# Altium footprint library devices.PCBLIB: 335 footprints (part 11 of 21)
Each footprint in its own frame and in the unit in brackets; x right, y up, seen from the top. Pads: shape width x height; smd on the part's side, far side on the other; paste and mask are expansions set on the pad; w line width, h text height; cw(c..) or ccw(c..) is an arc to the next point about the centre after c.
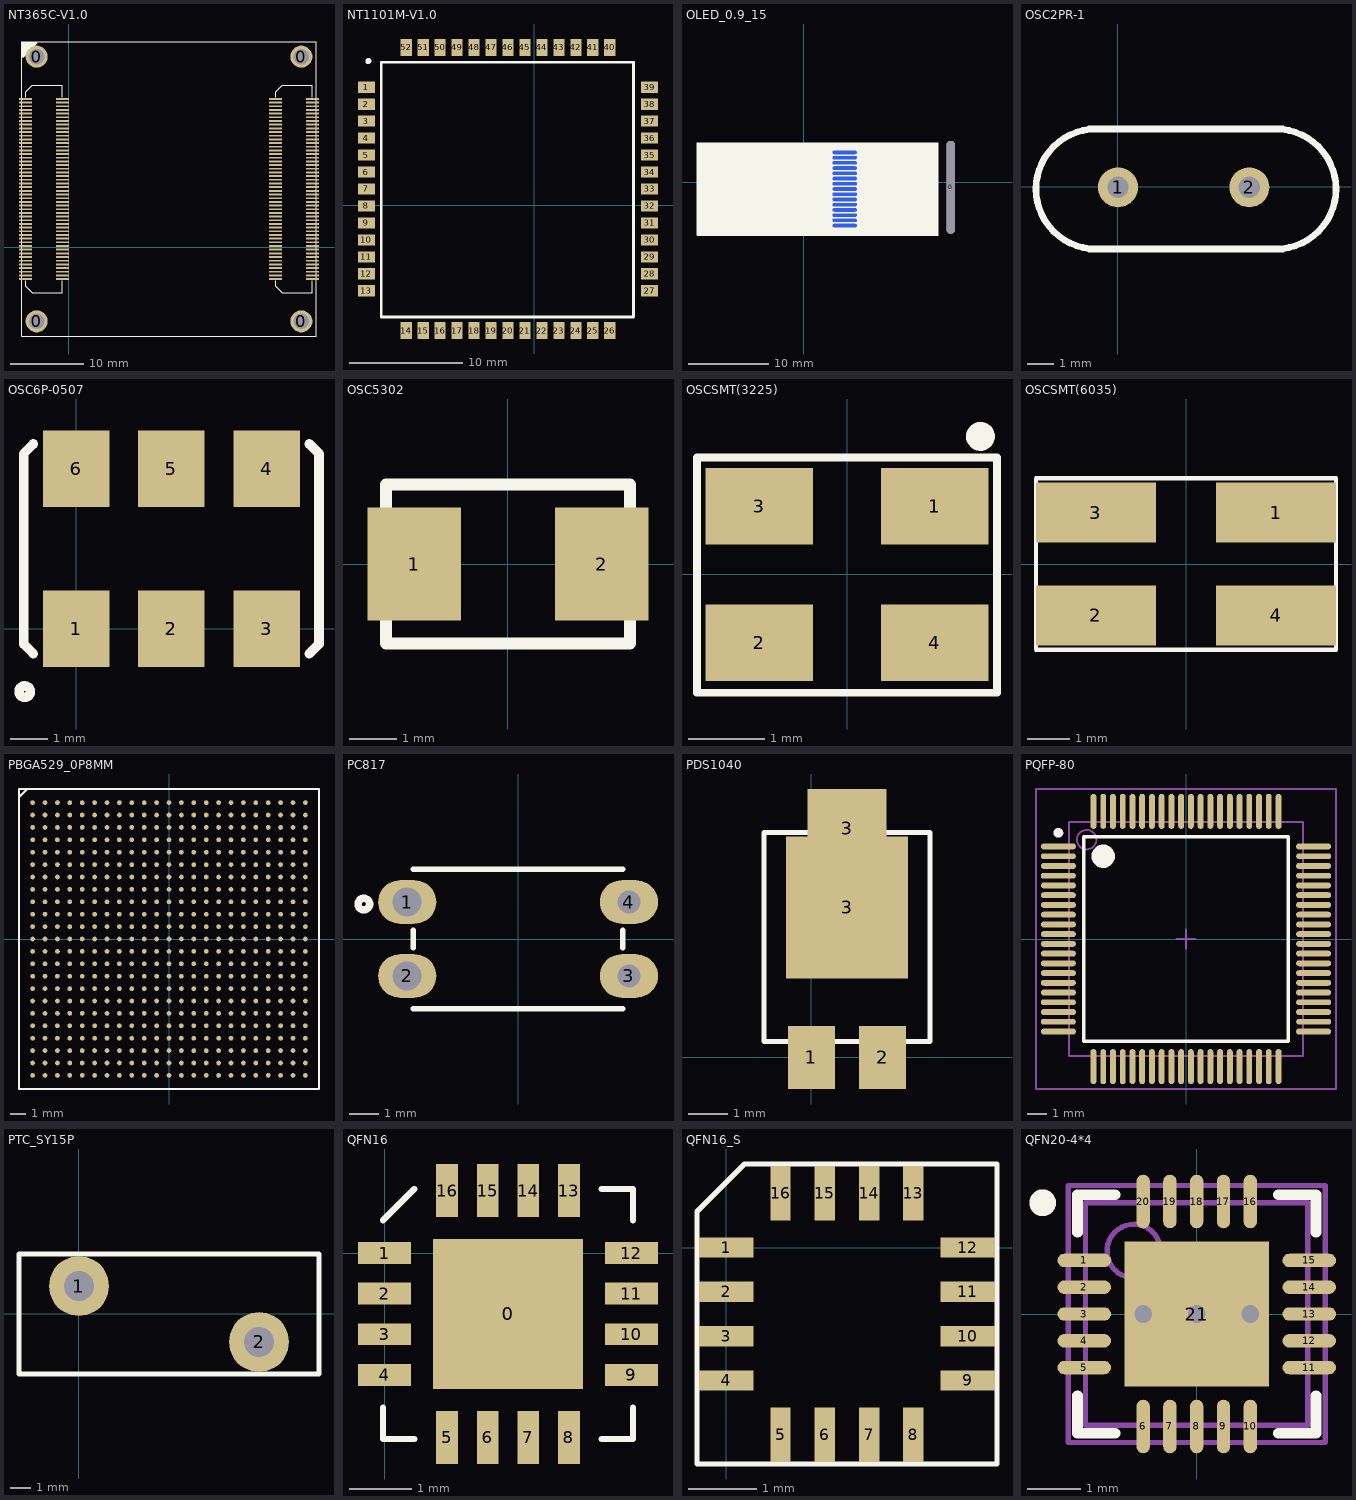
[diagram p10: the footprints below, top view; thin cyan lines are the x and y axes]

## NT365C-V1.0 [mm]
pads (204):
  round 3 hole 2.1: 0(-4.356,-10.048) 0(-4.356,25.952) 0(31.644,-10.048) 0(31.644,25.952)
  rect 1.8x0.25 smd: 1A(-0.856,20.202) 1B(33.144,20.202) 2A(-5.856,20.202) 2B(28.144,20.202) 3A(-0.856,19.702) 3B(33.144,19.702) 4A(-5.856,19.702) 4B(28.144,19.702) 5A(-0.856,19.202) 5B(33.144,19.202) 6A(-5.856,19.202) 6B(28.144,19.202) 7A(-0.856,18.702) 7B(33.144,18.702) 8A(-5.856,18.702) 8B(28.144,18.702) 9A(-0.856,18.202) 9B(33.144,18.202) 10A(-5.856,18.202) 10B(28.144,18.202) 11A(-0.856,17.702) 11B(33.144,17.702) 12A(-5.856,17.702) 12B(28.144,17.702) 13A(-0.856,17.202) 13B(33.144,17.202) 14A(-5.856,17.202) 14B(28.144,17.202) 15A(-0.856,16.702) 15B(33.144,16.702) 16A(-5.856,16.702) 16B(28.144,16.702) 17A(-0.856,16.202) 17B(33.144,16.202) 18A(-5.856,16.202) 18B(28.144,16.202) 19A(-0.856,15.702) 19B(33.144,15.702) 20A(-5.856,15.702) 20B(28.144,15.702) 21A(-0.856,15.202) 21B(33.144,15.202) 22A(-5.856,15.202) 22B(28.144,15.202) 23A(-0.856,14.702) 23B(33.144,14.702) 24A(-5.856,14.702) 24B(28.144,14.702) 25A(-0.856,14.202) 25B(33.144,14.202) 26A(-5.856,14.202) 26B(28.144,14.202) 27A(-0.856,13.702) 27B(33.144,13.702) 28A(-5.856,13.702) 28B(28.144,13.702) 29A(-0.856,13.202) 29B(33.144,13.202) 30A(-5.856,13.202) 30B(28.144,13.202) 31A(-0.856,12.702) 31B(33.144,12.702) 32A(-5.856,12.702) 32B(28.144,12.702) 33A(-0.856,12.202) 33B(33.144,12.202) 34A(-5.856,12.202) 34B(28.144,12.202) 35A(-0.856,11.702) 35B(33.144,11.702) 36A(-5.856,11.702) 36B(28.144,11.702) 37A(-0.856,11.202) 37B(33.144,11.202) 38A(-5.856,11.202) 38B(28.144,11.202) 39A(-0.856,10.702) 39B(33.144,10.702) 40A(-5.856,10.702) 40B(28.144,10.702) 41A(-0.856,10.202) 41B(33.144,10.202) 42A(-5.856,10.202) 42B(28.144,10.202) 43A(-0.856,9.702) 43B(33.144,9.702) 44A(-5.856,9.702) 44B(28.144,9.702) 45A(-0.856,9.202) 45B(33.144,9.202) 46A(-5.856,9.202) 46B(28.144,9.202) 47A(-0.856,8.702) 47B(33.144,8.702) 48A(-5.856,8.702) 48B(28.144,8.702) 49A(-0.856,8.202) 49B(33.144,8.202) 50A(-5.856,8.202) 50B(28.144,8.202) 51A(-0.856,7.702) 51B(33.144,7.702) 52A(-5.856,7.702) 52B(28.144,7.702) 53A(-0.856,7.202) 53B(33.144,7.202) 54A(-5.856,7.202) 54B(28.144,7.202) 55A(-0.856,6.702) 55B(33.144,6.702) 56A(-5.856,6.702) 56B(28.144,6.702) 57A(-0.856,6.202) 57B(33.144,6.202) 58A(-5.856,6.202) 58B(28.144,6.202) 59A(-0.856,5.702) 59B(33.144,5.702) 60A(-5.856,5.702) 60B(28.144,5.702) 61A(-0.856,5.202) 61B(33.144,5.202) 62A(-5.856,5.202) 62B(28.144,5.202) 63A(-0.856,4.702) 63B(33.144,4.702) 64A(-5.856,4.702) 64B(28.144,4.702) 65A(-0.856,4.202) 65B(33.144,4.202) 66A(-5.856,4.202) 66B(28.144,4.202) 67A(-0.856,3.702) 67B(33.144,3.702) 68A(-5.856,3.702) 68B(28.144,3.702) 69A(-0.856,3.202) 69B(33.144,3.202) 70A(-5.856,3.202) 70B(28.144,3.202) 71A(-0.856,2.702) 71B(33.144,2.702) 72A(-5.856,2.702) 72B(28.144,2.702) 73A(-0.856,2.202) 73B(33.144,2.202) 74A(-5.856,2.202) 74B(28.144,2.202) 75A(-0.856,1.702) 75B(33.144,1.702) 76A(-5.856,1.702) 76B(28.144,1.702) 77A(-0.856,1.202) 77B(33.144,1.202) 78A(-5.856,1.202) 78B(28.144,1.202) 79A(-0.856,0.702) 79B(33.144,0.702) 80A(-5.856,0.702) 80B(28.144,0.702) 81A(-0.856,0.202) 81B(33.144,0.202) 82A(-5.856,0.202) 82B(28.144,0.202) 83A(-0.856,-0.298) 83B(33.144,-0.298) 84A(-5.856,-0.298) 84B(28.144,-0.298) 85A(-0.856,-0.798) 85B(33.144,-0.798) 86A(-5.856,-0.798) 86B(28.144,-0.798) 87A(-0.856,-1.298) 87B(33.144,-1.298) 88A(-5.856,-1.298) 88B(28.144,-1.298) 89A(-0.856,-1.798) 89B(33.144,-1.798) 90A(-5.856,-1.798) 90B(28.144,-1.798) 91A(-0.856,-2.298) 91B(33.144,-2.298) 92A(-5.856,-2.298) 92B(28.144,-2.298) 93A(-0.856,-2.798) 93B(33.144,-2.798) 94A(-5.856,-2.798) 94B(28.144,-2.798) 95A(-0.856,-3.298) 95B(33.144,-3.298) 96A(-5.856,-3.298) 96B(28.144,-3.298) 97A(-0.856,-3.798) 97B(33.144,-3.798) 98A(-5.856,-3.798) 98B(28.144,-3.798) 99A(-0.856,-4.298) 99B(33.144,-4.298) 100A(-5.856,-4.298) 100B(28.144,-4.298)
Top Overlay:
  lines w0.127: -5.856,-4.548 -5.856,-5.248 -4.956,-6.148 -0.856,-6.148 -0.856,-4.548 ; -5.856,20.452 -5.856,21.152 -4.956,22.052 -0.856,22.052 -0.856,20.452 ; 28.144,-4.548 28.144,-5.248 29.044,-6.148 33.144,-6.148 33.144,-4.548 ; 28.144,20.452 28.144,21.152 29.044,22.052 33.144,22.052 33.144,20.452 ; -6.356,27.952 33.644,27.952 33.644,-12.048 -6.356,-12.048 -6.356,27.952 ; -6.356,27.952 -6.356,27.952
  lines w0.203: -6.265,25.881 -6.265,27.833 -4.309,27.833 -6.261,25.881 ; -6.265,26.099 -6.043,26.099 ; -6.265,26.302 -5.84,26.302 ; -6.265,26.505 -5.637,26.505 ; -6.265,26.708 -5.433,26.708 ; -6.265,26.912 -5.23,26.912 ; -6.265,27.115 -5.027,27.115 ; -6.265,27.318 -4.824,27.318 ; -6.265,27.521 -4.621,27.521 ; -6.265,27.724 -4.417,27.724 ; -6.185,25.957 -6.185,27.833 ; -5.982,26.16 -5.982,27.833 ; -5.778,26.363 -5.778,27.833 ; -5.575,26.567 -5.575,27.833 ; -5.372,26.77 -5.372,27.833 ; -5.169,26.973 -5.169,27.833 ; -4.966,27.176 -4.966,27.833 ; -4.762,27.379 -4.762,27.833 ; -4.559,27.583 -4.559,27.833

## NT1101M-V1.0 [mm]
pads (52):
  rect 1.5x1 smd: 1(-14.8,10.456) 2(-14.8,8.956) 3(-14.8,7.456) 4(-14.8,5.956) 5(-14.8,4.456) 6(-14.8,2.956) 7(-14.8,1.456) 8(-14.8,-0.044) 9(-14.8,-1.544) 10(-14.8,-3.044) 11(-14.8,-4.544) 12(-14.8,-6.044) 13(-14.8,-7.544) 27(10.2,-7.544) 28(10.2,-6.044) 29(10.2,-4.544) 30(10.2,-3.044) 31(10.2,-1.544) 32(10.2,-0.044) 33(10.2,1.456) 34(10.2,2.956) 35(10.2,4.456) 36(10.2,5.956) 37(10.2,7.456) 38(10.2,8.956) 39(10.2,10.456)
  rect 1x1.5 smd: 14(-11.3,-11.044) 15(-9.8,-11.044) 16(-8.3,-11.044) 17(-6.8,-11.044) 18(-5.3,-11.044) 19(-3.8,-11.044) 20(-2.3,-11.044) 21(-0.8,-11.044) 22(0.7,-11.044) 23(2.2,-11.044) 24(3.7,-11.044) 25(5.2,-11.044) 26(6.7,-11.044) 40(6.7,13.956) 41(5.2,13.956) 42(3.7,13.956) 43(2.2,13.956) 44(0.7,13.956) 45(-0.8,13.956) 46(-2.3,13.956) 47(-3.8,13.956) 48(-5.3,13.956) 49(-6.8,13.956) 50(-8.3,13.956) 51(-9.8,13.956) 52(-11.3,13.956)
Top Overlay:
  circle w0.254: c-14.641,12.756 r0.141
  lines w0.254: -13.5,-9.844 8.8,-9.844 8.8,12.656 -13.5,12.656 -13.5,-9.844

## OLED_0.9_15 [mm]
pads (16):
  oct 1x11.5 hole 1 slot 11.5 at 90 deg: 0(18.25,-0.65)
  oval 3x0.4 smd far side: 1(5.07,-5.41) 2(5.07,-4.76) 3(5.07,-4.11) 4(5.07,-3.46) 5(5.07,-2.81) 6(5.07,-2.16) 7(5.07,-1.51) 8(5.07,-0.86) 9(5.07,-0.21) 10(5.07,0.44) 11(5.07,1.09) 12(5.07,1.74) 13(5.07,2.39) 14(5.07,3.04) 15(5.07,3.69)
Top Overlay:
  rectangle: -13.292,-6.608 16.708,4.892
  lines w0.127: -0.75,0 0.75,0 ; 0,-0.65 0,0.65 ; -13.292,-6.608 16.708,-6.608 16.708,4.892 -13.292,4.892 -13.292,-6.608 ; -11.192,-2.792 -11.192,2.792 11.192,2.792 11.192,-2.792 -11.192,-2.792
Bottom Overlay:
  lines w0.127: 3.25,-6.06 3.25,4.34 17.5,4.34 17.5,-6.06 3.25,-6.06

## OSC2PR-1 [mil]
pads (2):
  round 60 hole 32: 1(0.17,-0.98) 2(197.17,-0.98)
Top Overlay:
  lines w10: -42.83,-93.48 247.17,-93.48 ; -42.83,86.52 247.17,86.52 ; -32.83,-93.48 cw(c-32.83,-3.48) -32.83,86.52 ; 237.17,-93.48 ccw(c237.17,-3.48) 237.17,86.52

## OSC6P-0507 [mil]
pads (6):
  rect 70x80 smd: 1(0,0) 2(100,0) 3(200,0) 4(200,168) 5(100,168) 6(0,168)
Top Overlay:
  circle w10: c-54,-66 r6
  lines w10: -45,-26 -55,-16 -55,184 -45,194 ; 245,-26 255,-16 255,184 245,194

## OSC5302 [mm]
pads (2):
  rect 2x2.4 smd: 1(-2,0) 2(2,0)
Top Overlay:
  lines w0.254: -2.6,-1.7 2.6,-1.7 2.6,1.7 -2.6,1.7 -2.6,-1.7

## OSCSMT(3225) [mm]
pads (4):
  rect 1.4x1 smd: 1(1.143,0.889) 2(-1.143,-0.889) 3(-1.143,0.889) 4(1.143,-0.889)
Top Overlay:
  circle w0.254: c1.739,1.8 r0.061
  lines w0.1: -1.956,-1.543 1.956,-1.543 1.956,1.524 -1.956,1.524 -1.956,-1.524
3D body: height 0.61, standoff 0, extent -1.575,-1.245 1.625,1.255

## OSCSMT(6035) [mm]
pads (4):
  rect 2.8x1.4 smd: 1(2.1,1.2) 2(-2.1,-1.2) 3(-2.1,1.2) 4(2.1,-1.2)
Top Overlay:
  lines w0.1: -3.5,-2 3.5,-2 3.5,2 -3.5,2 -3.5,-2

## PBGA529_0P8MM [mil] "PBGA529_0P8MM"
pads (529):
  round 12 smd: A1(-346.46,346.46) A2(-314.96,346.46) A3(-283.46,346.46) A4(-251.97,346.46) A5(-220.47,346.46) A6(-188.98,346.46) A7(-157.48,346.46) A8(-125.98,346.46) A9(-94.49,346.46) A10(-62.99,346.46) A11(-31.5,346.46) A12(0,346.46) A13(31.5,346.46) A14(62.99,346.46) A15(94.49,346.46) A16(125.98,346.46) A17(157.48,346.46) A18(188.98,346.46) A19(220.47,346.46) A20(251.97,346.46) A21(283.46,346.46) A22(314.96,346.46) A23(346.46,346.46) AA1(-346.46,-283.46) AA2(-314.96,-283.46) AA3(-283.46,-283.46) AA4(-251.97,-283.46) AA5(-220.47,-283.46) AA6(-188.98,-283.46) AA7(-157.48,-283.46) AA8(-125.98,-283.46) AA9(-94.49,-283.46) AA10(-62.99,-283.46) AA11(-31.5,-283.46) AA12(0,-283.46) AA13(31.5,-283.46) AA14(62.99,-283.46) AA15(94.49,-283.46) AA16(125.98,-283.46) AA17(157.48,-283.46) AA18(188.98,-283.46) AA19(220.47,-283.46) AA20(251.97,-283.46) AA21(283.46,-283.46) AA22(314.96,-283.46) AA23(346.46,-283.46) AB1(-346.46,-314.96) AB2(-314.96,-314.96) AB3(-283.46,-314.96) AB4(-251.97,-314.96) AB5(-220.47,-314.96) AB6(-188.98,-314.96) AB7(-157.48,-314.96) AB8(-125.98,-314.96) AB9(-94.49,-314.96) AB10(-62.99,-314.96) AB11(-31.5,-314.96) AB12(0,-314.96) AB13(31.5,-314.96) AB14(62.99,-314.96) AB15(94.49,-314.96) AB16(125.98,-314.96) AB17(157.48,-314.96) AB18(188.98,-314.96) AB19(220.47,-314.96) AB20(251.97,-314.96) AB21(283.46,-314.96) AB22(314.96,-314.96) AB23(346.46,-314.96) AC1(-346.46,-346.46) AC2(-314.96,-346.46) AC3(-283.46,-346.46) AC4(-251.97,-346.46) AC5(-220.47,-346.46) AC6(-188.98,-346.46) AC7(-157.48,-346.46) AC8(-125.98,-346.46) AC9(-94.49,-346.46) AC10(-62.99,-346.46) AC11(-31.5,-346.46) AC12(0,-346.46) AC13(31.5,-346.46) AC14(62.99,-346.46) AC15(94.49,-346.46) AC16(125.98,-346.46) AC17(157.48,-346.46) AC18(188.98,-346.46) AC19(220.47,-346.46) AC20(251.97,-346.46) AC21(283.46,-346.46) AC22(314.96,-346.46) AC23(346.46,-346.46) B1(-346.46,314.96) B2(-314.96,314.96) B3(-283.46,314.96) B4(-251.97,314.96) B5(-220.47,314.96) B6(-188.98,314.96) B7(-157.48,314.96) B8(-125.98,314.96) B9(-94.49,314.96) B10(-62.99,314.96) B11(-31.5,314.96) B12(0,314.96) B13(31.5,314.96) B14(62.99,314.96) B15(94.49,314.96) B16(125.98,314.96) B17(157.48,314.96) B18(188.98,314.96) B19(220.47,314.96) B20(251.97,314.96) B21(283.46,314.96) B22(314.96,314.96) B23(346.46,314.96) C1(-346.46,283.46) C2(-314.96,283.46) C3(-283.46,283.46) C4(-251.97,283.46) C5(-220.47,283.46) C6(-188.98,283.46) C7(-157.48,283.46) C8(-125.98,283.46) C9(-94.49,283.46) C10(-62.99,283.46) C11(-31.5,283.46) C12(0,283.46) C13(31.5,283.46) C14(62.99,283.46) C15(94.49,283.46) C16(125.98,283.46) C17(157.48,283.46) C18(188.98,283.46) C19(220.47,283.46) C20(251.97,283.46) C21(283.46,283.46) C22(314.96,283.46) C23(346.46,283.46) D1(-346.46,251.97) D2(-314.96,251.97) D3(-283.46,251.97) D4(-251.97,251.97) D5(-220.47,251.97) D6(-188.98,251.97) D7(-157.48,251.97) D8(-125.98,251.97) D9(-94.49,251.97) D10(-62.99,251.97) D11(-31.5,251.97) D12(0,251.97) D13(31.5,251.97) D14(62.99,251.97) D15(94.49,251.97) D16(125.98,251.97) D17(157.48,251.97) D18(188.98,251.97) D19(220.47,251.97) D20(251.97,251.97) D21(283.46,251.97) D22(314.96,251.97) D23(346.46,251.97) E1(-346.46,220.47) E2(-314.96,220.47) E3(-283.46,220.47) E4(-251.97,220.47) E5(-220.47,220.47) E6(-188.98,220.47) E7(-157.48,220.47) E8(-125.98,220.47) E9(-94.49,220.47) E10(-62.99,220.47) E11(-31.5,220.47) E12(0,220.47) E13(31.5,220.47) E14(62.99,220.47) E15(94.49,220.47) E16(125.98,220.47) E17(157.48,220.47) E18(188.98,220.47) E19(220.47,220.47) E20(251.97,220.47) E21(283.46,220.47) E22(314.96,220.47) E23(346.46,220.47) F1(-346.46,188.98) F2(-314.96,188.98) F3(-283.46,188.98) F4(-251.97,188.98) F5(-220.47,188.98) F6(-188.98,188.98) F7(-157.48,188.98) F8(-125.98,188.98) F9(-94.49,188.98) F10(-62.99,188.98) F11(-31.5,188.98) F12(0,188.98) F13(31.5,188.98) F14(62.99,188.98) F15(94.49,188.98) F16(125.98,188.98) F17(157.48,188.98) F18(188.98,188.98) F19(220.47,188.98) F20(251.97,188.98) F21(283.46,188.98) F22(314.96,188.98) F23(346.46,188.98) G1(-346.46,157.48) G2(-314.96,157.48) G3(-283.46,157.48) G4(-251.97,157.48) G5(-220.47,157.48) G6(-188.98,157.48) G7(-157.48,157.48) G8(-125.98,157.48) G9(-94.49,157.48) G10(-62.99,157.48) G11(-31.5,157.48) G12(0,157.48) G13(31.5,157.48) G14(62.99,157.48) G15(94.49,157.48) G16(125.98,157.48) G17(157.48,157.48) G18(188.98,157.48) G19(220.47,157.48) G20(251.97,157.48) G21(283.46,157.48) G22(314.96,157.48) G23(346.46,157.48) H1(-346.46,125.98) H2(-314.96,125.98) H3(-283.46,125.98) H4(-251.97,125.98) H5(-220.47,125.98) H6(-188.98,125.98) H7(-157.48,125.98) H8(-125.98,125.98) H9(-94.49,125.98) H10(-62.99,125.98) H11(-31.5,125.98) H12(0,125.98) H13(31.5,125.98) H14(62.99,125.98) H15(94.49,125.98) H16(125.98,125.98) H17(157.48,125.98) H18(188.98,125.98) H19(220.47,125.98) H20(251.97,125.98) H21(283.46,125.98) H22(314.96,125.98) H23(346.46,125.98) J1(-346.46,94.49) J2(-314.96,94.49) J3(-283.46,94.49) J4(-251.97,94.49) J5(-220.47,94.49) J6(-188.98,94.49) J7(-157.48,94.49) J8(-125.98,94.49) J9(-94.49,94.49) J10(-62.99,94.49) J11(-31.5,94.49) J12(0,94.49) J13(31.5,94.49) J14(62.99,94.49) J15(94.49,94.49) J16(125.98,94.49) J17(157.48,94.49) J18(188.98,94.49) J19(220.47,94.49) J20(251.97,94.49) J21(283.46,94.49) J22(314.96,94.49) J23(346.46,94.49) K1(-346.46,62.99) K2(-314.96,62.99) K3(-283.46,62.99) K4(-251.97,62.99) K5(-220.47,62.99) K6(-188.98,62.99) K7(-157.48,62.99) K8(-125.98,62.99) K9(-94.49,62.99) K10(-62.99,62.99) K11(-31.5,62.99) K12(0,62.99) K13(31.5,62.99) K14(62.99,62.99) K15(94.49,62.99) K16(125.98,62.99) K17(157.48,62.99) K18(188.98,62.99) K19(220.47,62.99) K20(251.97,62.99) K21(283.46,62.99) K22(314.96,62.99) K23(346.46,62.99) L1(-346.46,31.5) L2(-314.96,31.5) L3(-283.46,31.5) L4(-251.97,31.5) L5(-220.47,31.5) L6(-188.98,31.5) L7(-157.48,31.5) L8(-125.98,31.5) L9(-94.49,31.5) L10(-62.99,31.5) L11(-31.5,31.5) L12(0,31.5) L13(31.5,31.5) L14(62.99,31.5) L15(94.49,31.5) L16(125.98,31.5) L17(157.48,31.5) L18(188.98,31.5) L19(220.47,31.5) L20(251.97,31.5) L21(283.46,31.5) L22(314.96,31.5) L23(346.46,31.5) M1(-346.46,0) M2(-314.96,0) M3(-283.46,0) M4(-251.97,0) M5(-220.47,0) M6(-188.98,0) M7(-157.48,0) M8(-125.98,0) M9(-94.49,0) M10(-62.99,0) M11(-31.5,0) M12(0,0) M13(31.5,0) M14(62.99,0) M15(94.49,0) M16(125.98,0) M17(157.48,0) M18(188.98,0) M19(220.47,0) M20(251.97,0) M21(283.46,0) M22(314.96,0) M23(346.46,0) N1(-346.46,-31.5) N2(-314.96,-31.5) N3(-283.46,-31.5) N4(-251.97,-31.5) N5(-220.47,-31.5) N6(-188.98,-31.5) N7(-157.48,-31.5) N8(-125.98,-31.5) N9(-94.49,-31.5) N10(-62.99,-31.5) N11(-31.5,-31.5) N12(0,-31.5) N13(31.5,-31.5) N14(62.99,-31.5) N15(94.49,-31.5) N16(125.98,-31.5) N17(157.48,-31.5) N18(188.98,-31.5) N19(220.47,-31.5) N20(251.97,-31.5) N21(283.46,-31.5) N22(314.96,-31.5) N23(346.46,-31.5) P1(-346.46,-62.99) P2(-314.96,-62.99) P3(-283.46,-62.99) P4(-251.97,-62.99) P5(-220.47,-62.99) P6(-188.98,-62.99) P7(-157.48,-62.99) P8(-125.98,-62.99) P9(-94.49,-62.99) P10(-62.99,-62.99) P11(-31.5,-62.99) P12(0,-62.99) P13(31.5,-62.99) P14(62.99,-62.99) P15(94.49,-62.99) P16(125.98,-62.99) P17(157.48,-62.99) P18(188.98,-62.99) P19(220.47,-62.99) P20(251.97,-62.99) P21(283.46,-62.99) P22(314.96,-62.99) P23(346.46,-62.99) R1(-346.46,-94.49) R2(-314.96,-94.49) R3(-283.46,-94.49) R4(-251.97,-94.49) R5(-220.47,-94.49) R6(-188.98,-94.49) R7(-157.48,-94.49) R8(-125.98,-94.49) R9(-94.49,-94.49) R10(-62.99,-94.49) R11(-31.5,-94.49) R12(0,-94.49) R13(31.5,-94.49) R14(62.99,-94.49) R15(94.49,-94.49) R16(125.98,-94.49) R17(157.48,-94.49) R18(188.98,-94.49) R19(220.47,-94.49) R20(251.97,-94.49) R21(283.46,-94.49) R22(314.96,-94.49) R23(346.46,-94.49) T1(-346.46,-125.98) T2(-314.96,-125.98) T3(-283.46,-125.98) T4(-251.97,-125.98) T5(-220.47,-125.98) T6(-188.98,-125.98) T7(-157.48,-125.98) T8(-125.98,-125.98) T9(-94.49,-125.98) T10(-62.99,-125.98) T11(-31.5,-125.98) T12(0,-125.98) T13(31.5,-125.98) T14(62.99,-125.98) T15(94.49,-125.98) T16(125.98,-125.98) T17(157.48,-125.98) T18(188.98,-125.98) T19(220.47,-125.98) T20(251.97,-125.98) T21(283.46,-125.98) T22(314.96,-125.98) T23(346.46,-125.98) U1(-346.46,-157.48) U2(-314.96,-157.48) U3(-283.46,-157.48) U4(-251.97,-157.48) U5(-220.47,-157.48) U6(-188.98,-157.48) U7(-157.48,-157.48) U8(-125.98,-157.48) U9(-94.49,-157.48) U10(-62.99,-157.48) U11(-31.5,-157.48) U12(0,-157.48) U13(31.5,-157.48) U14(62.99,-157.48) U15(94.49,-157.48) U16(125.98,-157.48) U17(157.48,-157.48) U18(188.98,-157.48) U19(220.47,-157.48) U20(251.97,-157.48) U21(283.46,-157.48) U22(314.96,-157.48) U23(346.46,-157.48) V1(-346.46,-188.98) V2(-314.96,-188.98) V3(-283.46,-188.98) V4(-251.97,-188.98) V5(-220.47,-188.98) V6(-188.98,-188.98) V7(-157.48,-188.98) V8(-125.98,-188.98) V9(-94.49,-188.98) V10(-62.99,-188.98) V11(-31.5,-188.98) V12(0,-188.98) V13(31.5,-188.98) V14(62.99,-188.98) V15(94.49,-188.98) V16(125.98,-188.98) V17(157.48,-188.98) V18(188.98,-188.98) V19(220.47,-188.98) V20(251.97,-188.98) V21(283.46,-188.98) V22(314.96,-188.98) V23(346.46,-188.98) W1(-346.46,-220.47) W2(-314.96,-220.47) W3(-283.46,-220.47) W4(-251.97,-220.47) W5(-220.47,-220.47) W6(-188.98,-220.47) W7(-157.48,-220.47) W8(-125.98,-220.47) W9(-94.49,-220.47) W10(-62.99,-220.47) W11(-31.5,-220.47) W12(0,-220.47) W13(31.5,-220.47) W14(62.99,-220.47) W15(94.49,-220.47) W16(125.98,-220.47) W17(157.48,-220.47) W18(188.98,-220.47) W19(220.47,-220.47) W20(251.97,-220.47) W21(283.46,-220.47) W22(314.96,-220.47) W23(346.46,-220.47) Y1(-346.46,-251.97) Y2(-314.96,-251.97) Y3(-283.46,-251.97) Y4(-251.97,-251.97) Y5(-220.47,-251.97) Y6(-188.98,-251.97) Y7(-157.48,-251.97) Y8(-125.98,-251.97) Y9(-94.49,-251.97) Y10(-62.99,-251.97) Y11(-31.5,-251.97) Y12(0,-251.97) Y13(31.5,-251.97) Y14(62.99,-251.97) Y15(94.49,-251.97) Y16(125.98,-251.97) Y17(157.48,-251.97) Y18(188.98,-251.97) Y19(220.47,-251.97) Y20(251.97,-251.97) Y21(283.46,-251.97) Y22(314.96,-251.97) Y23(346.46,-251.97)
Top Overlay:
  lines w5: -381.02,360 -360,381.02 ; -381.02,-381.02 381.02,-381.02 381.02,381.02 -381.02,381.02 -381.02,-381.02

## PC817 [mm]
pads (4):
  oval 2x1.5 hole 1: 1(-3.81,1.27) 2(-3.81,-1.27)
  oval 2x1.5 hole 0.8: 3(3.81,-1.27) 4(3.81,1.27)
Top Overlay:
  circle w0.254: c-5.3,1.2 r0.2
  lines w0.2: -3.6,-2.4 3.6,-2.4 ; -3.6,-0.3 -3.6,0.3 -3.6,0.1 ; -3.6,2.4 3.6,2.4 ; 3.6,-0.3 3.6,0.3

## PDS1040 [mm]
pads (4):
  rect 1.2x1.6 smd: 1(0,0) 2(1.8,0)
  rect 3.1x3.6 smd: 3(0.9,3.8)
  rect 2x2 smd: 3(0.9,5.8)
Top Overlay:
  lines w0.127: -1.2,0.4 -1.2,5.7 3,5.7 3,0.4 -1.2,0.4

## PQFP-80 [mm] "Shrink QFP, 80-Leads, Body 12x12mm, Pitch 0.5mm, IPC Medium Density"
height 1.7
pads (80):
  oval 1.8x0.3 smd: 1(-6.55,4.75) 2(-6.55,4.25) 3(-6.55,3.75) 4(-6.55,3.25) 5(-6.55,2.75) 6(-6.55,2.25) 7(-6.55,1.75) 8(-6.55,1.25) 9(-6.55,0.75) 10(-6.55,0.25) 11(-6.55,-0.25) 12(-6.55,-0.75) 13(-6.55,-1.25) 14(-6.55,-1.75) 15(-6.55,-2.25) 16(-6.55,-2.75) 17(-6.55,-3.25) 18(-6.55,-3.75) 19(-6.55,-4.25) 20(-6.55,-4.75) 41(6.55,-4.75) 42(6.55,-4.25) 43(6.55,-3.75) 44(6.55,-3.25) 45(6.55,-2.75) 46(6.55,-2.25) 47(6.55,-1.75) 48(6.55,-1.25) 49(6.55,-0.75) 50(6.55,-0.25) 51(6.55,0.25) 52(6.55,0.75) 53(6.55,1.25) 54(6.55,1.75) 55(6.55,2.25) 56(6.55,2.75) 57(6.55,3.25) 58(6.55,3.75) 59(6.55,4.25) 60(6.55,4.75)
  oval 0.3x1.8 smd: 21(-4.75,-6.55) 22(-4.25,-6.55) 23(-3.75,-6.55) 24(-3.25,-6.55) 25(-2.75,-6.55) 26(-2.25,-6.55) 27(-1.75,-6.55) 28(-1.25,-6.55) 29(-0.75,-6.55) 30(-0.25,-6.55) 31(0.25,-6.55) 32(0.75,-6.55) 33(1.25,-6.55) 34(1.75,-6.55) 35(2.25,-6.55) 36(2.75,-6.55) 37(3.25,-6.55) 38(3.75,-6.55) 39(4.25,-6.55) 40(4.75,-6.55) 61(4.75,6.55) 62(4.25,6.55) 63(3.75,6.55) 64(3.25,6.55) 65(2.75,6.55) 66(2.25,6.55) 67(1.75,6.55) 68(1.25,6.55) 69(0.75,6.55) 70(0.25,6.55) 71(-0.25,6.55) 72(-0.75,6.55) 73(-1.25,6.55) 74(-1.75,6.55) 75(-2.25,6.55) 76(-2.75,6.55) 77(-3.25,6.55) 78(-3.75,6.55) 79(-4.25,6.55) 80(-4.75,6.55)
Top Overlay:
  circle w0.25: c-6.55,5.45 r0.125
  circle w0.6: c-4.25,4.25 r0.3
  lines w0.2: -5.25,-5.25 -5.25,5.25 5.25,5.25 5.25,-5.25 -5.25,-5.25
Mechanical 13:
  circle w0.1: c-5.1,5.1 r0.5
  lines w0.1: -6,-6 -6,6 6,6 6,-6 -6,-6
Mechanical 15:
  lines w0.1: -0.5,0 0.5,0 ; 0,-0.5 0,0.5 ; -7.7,-7.7 -7.7,7.7 7.7,7.7 7.7,-7.7 -7.7,-7.7
3D body: height 1.7, standoff 0, extent -6,-6 6,6

## PTC_SY15P [mm]
pads (2):
  round 3 hole 1.5: 1(0,1.4) 2(9,-1.4)
Top Overlay:
  lines w0.254: -3,-3 -3,3 12,3 12,-3 -3,-3

## QFN16 [mm]
pads (17):
  rect 2.4x2.4 smd: 0(1.975,-0.975)
  rect 0.85x0.35 smd: 1(0,0) 2(0,-0.65) 3(0,-1.3) 4(0,-1.95) 9(3.95,-1.95) 10(3.95,-1.3) 11(3.95,-0.65) 12(3.95,0)
  rect 0.35x0.85 smd: 5(1,-2.95) 6(1.65,-2.95) 7(2.3,-2.95) 8(2.95,-2.95) 13(2.95,1) 14(2.3,1) 15(1.65,1) 16(1,1)
Top Overlay:
  lines w0.1: -0.025,-2.475 -0.025,-2.975 0.475,-2.975 ; -0.025,0.525 0.475,1.025 ; 3.475,-2.975 3.975,-2.975 3.975,-2.475 ; 3.475,1.025 3.975,1.025 3.975,0.525

## QFN16_S [mm]
pads (16):
  rect 0.8x0.3 smd: 1(0,0) 2(0,-0.65) 3(0,-1.3) 4(0,-1.95) 9(3.542,-1.95) 10(3.542,-1.3) 11(3.542,-0.65) 12(3.542,0)
  rect 0.3x0.8 smd: 5(0.795,-2.744) 6(1.445,-2.744) 7(2.095,-2.744) 8(2.745,-2.744) 13(2.745,0.797) 14(2.095,0.797) 15(1.445,0.797) 16(0.795,0.797)
Top Overlay:
  lines w0.076: -0.43,-3.175 -0.43,0.528 0.268,1.225 3.97,1.225 3.97,-3.175 -0.43,-3.175

## QFN20-4*4 [mm] "QFN, 20-Leads, Body 4x4mm, Pitch 0.5mm, IPC High Density"
height 0.8
pads (21):
  oval 1x0.25 smd: 1(-2.1,1) 2(-2.1,0.5) 3(-2.1,0) 4(-2.1,-0.5) 5(-2.1,-1) 11(2.1,-1) 12(2.1,-0.5) 13(2.1,0) 14(2.1,0.5) 15(2.1,1)
  oval 0.25x1 smd: 6(-1,-2.1) 7(-0.5,-2.1) 8(0,-2.1) 9(0.5,-2.1) 10(1,-2.1) 16(1,2.1) 17(0.5,2.1) 18(0,2.1) 19(-0.5,2.1) 20(-1,2.1)
  rect 2.7x2.7 smd: 21(0,0)
via 1,0 diameter 0.66 hole 0.33
via -1,0 diameter 0.66 hole 0.33
via 0,0 diameter 0.66 hole 0.33
Top Overlay:
  circle w0.25: c-2.875,2.075 r0.125
  lines w0.2: -2.225,-1.525 -2.225,-2.225 -1.525,-2.225 ; -2.225,1.525 -2.225,2.225 -1.525,2.225 ; 1.525,-2.225 2.225,-2.225 2.225,-1.525 ; 1.525,2.225 2.225,2.225 2.225,1.525
Mechanical 13:
  circle w0.1: c-1.175,1.175 r0.5
  lines w0.1: -2.075,-2.075 2.075,-2.075 2.075,2.075 -2.075,2.075 -2.075,-2.075
Mechanical 15:
  lines w0.1: -0.5,0 0.5,0 ; 0,-0.5 0,0.5 ; -2.4,-2.4 2.4,-2.4 2.4,2.4 -2.4,2.4 -2.4,-2.4
3D body: height 0.8, standoff 0, extent -2.075,-2.075 2.075,2.075